# Altium footprint library esd_library.PcbLib: 57 footprints (part 1 of 4)
Each footprint in its own frame and in the unit in brackets; x right, y up, seen from the top. Pads: shape width x height; smd on the part's side, far side on the other; paste and mask are expansions set on the pad; w line width, h text height; cw(c..) or ccw(c..) is an arc to the next point about the centre after c.
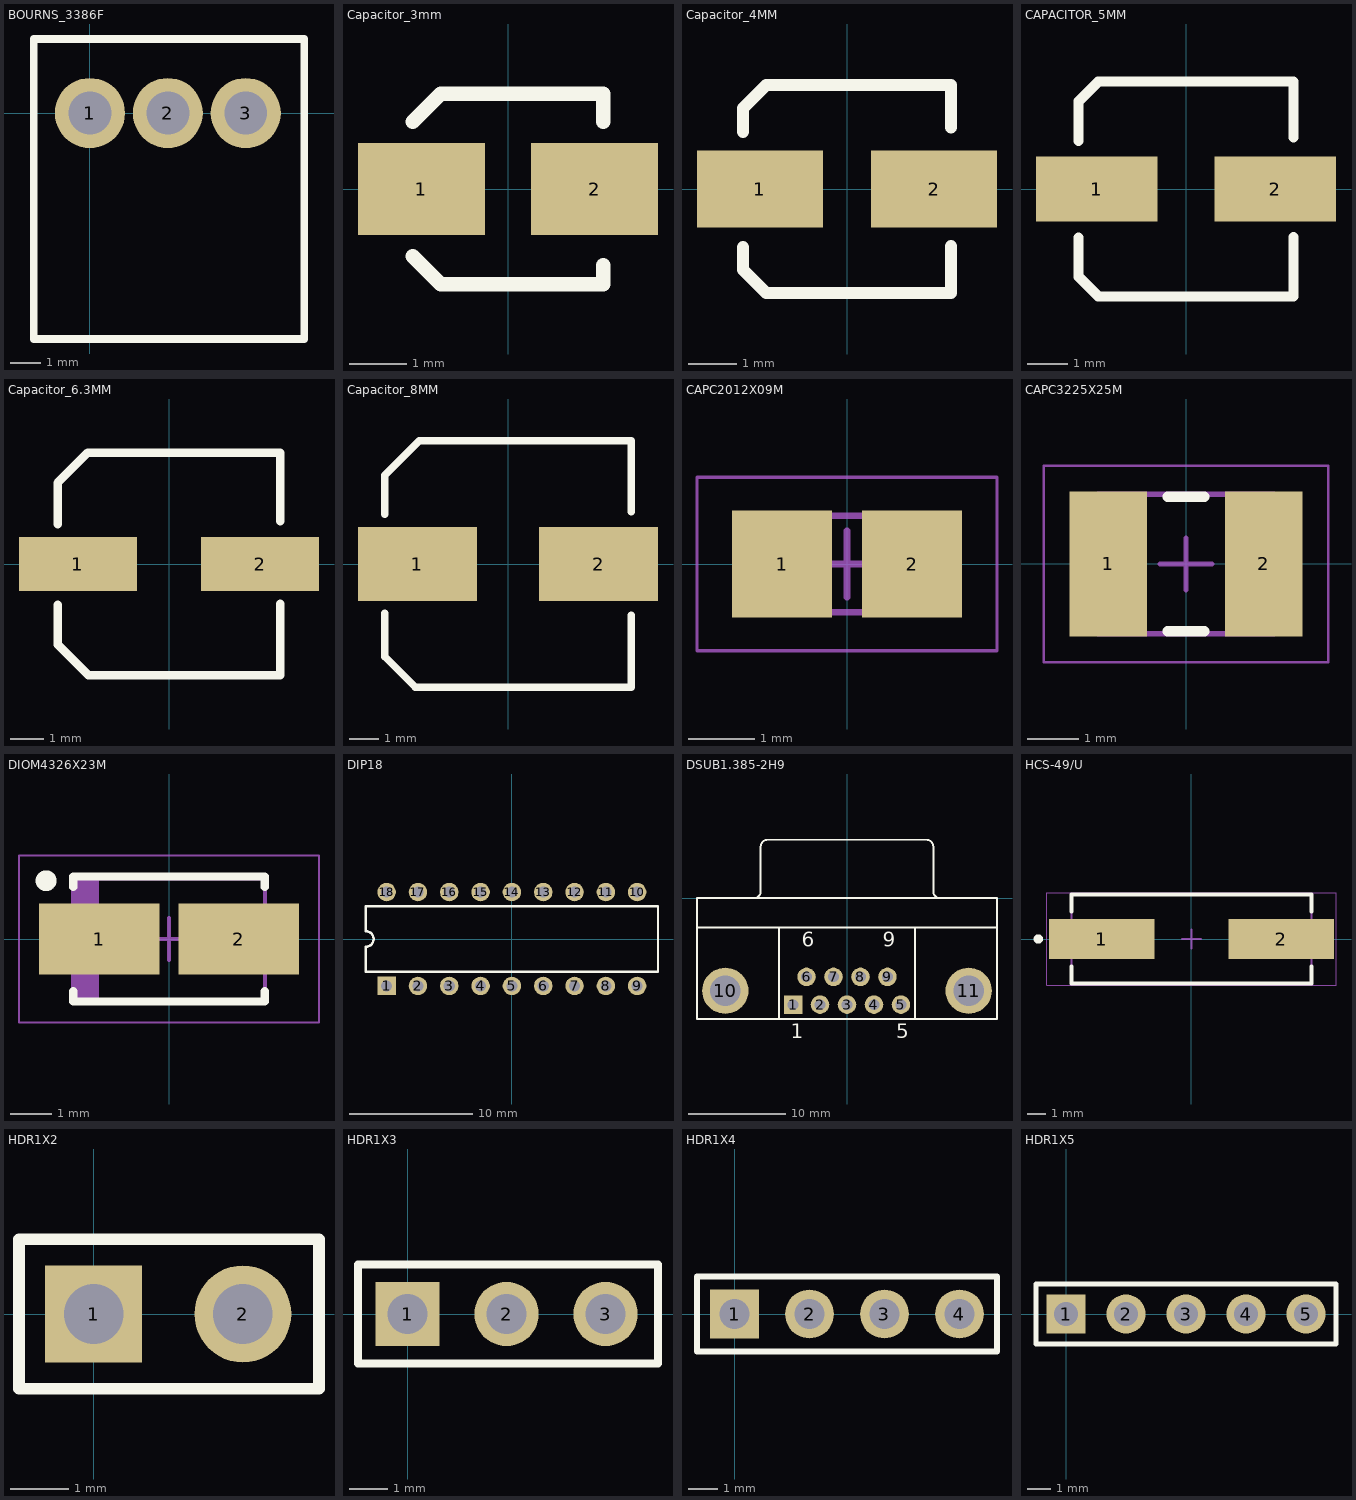
[diagram p0: the footprints below, top view; thin cyan lines are the x and y axes]

## BOURNS_3386F [mil] "Top Adjust Trimpot"
pads (3):
  round 90 hole 55: 1(0,0) 2(100,0) 3(200,0)
Top Overlay:
  lines w10: -72,-290 275,-290 275,95 -72,95 -72,-290
3D body "User Library-3352T.step": height 150, standoff -187.01, extent -73.99,-286 275.99,89

## Capacitor_3mm [mm]
pads (2):
  rect 2.2x1.6 smd: 1(-1.5,0) 2(1.5,0)
Top Overlay:
  lines w0.254: -1.65,-1.168 -1.168,-1.65 1.65,-1.65 1.65,-1.321 ; -1.65,1.168 -1.168,1.65 1.65,1.65 1.65,1.168
3D body "C-4X6_1.stp": height 6.15, standoff 0, extent -2.6,-2.15 2.6,2.15

## Capacitor_4MM [mm]
pads (2):
  rect 2.6x1.6 smd: 1(-1.8,0) 2(1.8,0)
Top Overlay:
  lines w0.254: -2.15,-1.203 -2.15,-1.668 -1.668,-2.15 2.15,-2.15 2.15,-1.185 ; -2.15,1.185 -2.15,1.668 -1.668,2.15 2.15,2.15 2.15,1.27
3D body "C-4X6_1.stp": height 6.15, standoff 0, extent -2.6,-2.15 2.6,2.15

## CAPACITOR_5MM [mm]
pads (2):
  rect 3x1.6 smd: 1(-2.2,0) 2(2.2,0)
Top Overlay:
  lines w0.254: -2.65,-1.203 -2.65,-2.168 -2.168,-2.65 2.65,-2.65 2.65,-1.185 ; -2.65,1.185 -2.65,2.168 -2.168,2.65 2.65,2.65 2.65,1.27
3D body "C-5X6_1.stp": height 6.15, standoff 0, extent -3.1,-2.65 3.1,2.65

## Capacitor_6.3MM [mm]
pads (2):
  rect 3.5x1.6 smd: 1(-2.7,0) 2(2.7,0)
Top Overlay:
  lines w0.254: -3.3,-1.203 -3.3,-2.39 -2.39,-3.3 3.3,-3.3 3.3,-1.185 ; -3.3,1.185 -3.3,2.415 -2.415,3.3 3.3,3.3 3.3,1.27
3D body "C-6_3X8.stp": height 8.1, standoff 0, extent -3.8,-3.3 3.8,3.3

## Capacitor_8MM [mm]
pads (2):
  rect 4x2.5 smd: 1(-3.05,0) 2(3.05,0)
Top Overlay:
  lines w0.254: -4.15,-1.651 -4.15,-3.114 -3.114,-4.15 4.15,-4.15 4.15,-1.727 ; -4.15,1.676 -4.15,2.987 -2.987,4.15 4.15,4.15 4.15,1.753
3D body "C-8X10_5.stp": height 10.45, standoff 0, extent -4.65,-4.15 4.65,4.15

## CAPC2012X09M [mm] "Chip Capacitor, 2-Leads, Body 2.00x1.25mm, IPC Low Density"
height 0.88
pads (2):
  rect 1.5x1.6 smd: 1(-0.975,0) 2(0.975,0)
Mechanical 13:
  lines w0.1: -1.1,-0.725 1.1,-0.725 1.1,0.725 -1.1,0.725 -1.1,-0.725
Mechanical 15:
  lines w0.05: -2.25,-1.3 2.25,-1.3 2.25,1.3 -2.25,1.3 -2.25,-1.3
  lines w0.1: -0.5,0 0.5,0 ; 0,-0.5 0,0.5
3D body: height 0.88, standoff 0, extent 0.6,-0.725 1.1,0.725
3D body: height 0.88, standoff 0, extent -1.1,-0.725 -0.6,0.725
3D body: height 0.88, standoff 0, extent -0.6,-0.725 0.6,0.725

## CAPC3225X25M [mm] "Chip Capacitor, 2-Leads, Body 3.20x2.50mm, IPC Low Density"
height 2.5
pads (2):
  rect 1.5x2.8 smd: 1(-1.5,0) 2(1.5,0)
Top Overlay:
  lines w0.2: -0.35,-1.3 0.35,-1.3 ; -0.35,1.3 0.35,1.3
Mechanical 13:
  lines w0.1: -1.7,-1.35 1.7,-1.35 1.7,1.35 -1.7,1.35 -1.7,-1.35
Mechanical 15:
  lines w0.05: -2.75,-1.9 2.75,-1.9 2.75,1.9 -2.75,1.9 -2.75,-1.9
  lines w0.1: -0.5,0 0.5,0 ; 0,-0.5 0,0.5
3D body: height 2.5, standoff 0, extent 1.2,-1.35 1.7,1.35
3D body: height 2.5, standoff 0, extent -1.7,-1.35 -1.2,1.35
3D body: height 2.5, standoff 0, extent -1.2,-1.35 1.2,1.35

## DIOM4326X23M [mm] "Molded Diode, 2-Leads, Body 4.30x2.60mm, IPC Low Density"
height 2.3
pads (2):
  rect 2.9x1.7 smd: 1(-1.675,0) 2(1.675,0)
Top Overlay:
  circle w0.25: c-2.95,1.4 r0.125
  lines w0.2: -2.3,-1.25 -2.3,-1.5 2.3,-1.5 2.3,-1.25 ; -2.3,1.25 -2.3,1.5 2.3,1.5 2.3,1.25
Mechanical 13:
  rectangle: -2.3,-1.46 -1.681,1.46
  lines w0.1: -2.3,-1.46 -2.3,1.46 2.3,1.46 2.3,-1.46 -2.3,-1.46
Mechanical 15:
  lines w0.05: -3.6,-2 -3.6,2 3.6,2 3.6,-2 -3.6,-2
  lines w0.1: -0.5,0 0.5,0 ; 0,-0.5 0,0.5
3D body "User Library-DO-214AC(SMA).step": height 2.36, standoff 0.08, extent -2.743,-1.397 2.743,1.397

## DIP18 [mm] "DIP; 18 Leads; Row Spacing 7.62 mm; Pitch 2.54 mm"
height 3.93
pads (18):
  rect 1.5x1.5 hole 0.9: 1(-10.16,-3.81)
  round 1.5 hole 0.9: 2(-7.62,-3.81) 3(-5.08,-3.81) 4(-2.54,-3.81) 5(0,-3.81) 6(2.54,-3.81) 7(5.08,-3.81) 8(7.62,-3.81) 9(10.16,-3.81) 10(10.16,3.81) 11(7.62,3.81) 12(5.08,3.81) 13(2.54,3.81) 14(0,3.81) 15(-2.54,3.81) 16(-5.08,3.81) 17(-7.62,3.81) 18(-10.16,3.81)
Top Overlay:
  lines w0.2: -11.85,-2.65 11.85,-2.65 11.85,2.65 -11.85,2.65 -11.85,0.635 cw(c-11.85,0) -11.85,-0.635 -11.85,-2.65
3D body "DIP18.step": height 6.35, standoff -1.65, extent -11.405,-3.873 11.455,3.874

## DSUB1.385-2H9 [mm] "Connector; D Subminiature; 9 Position; Right Angle; Pitch 1.385 mm"
height 12.75
pads (11):
  rect 1.905x1.905 hole 1.09: 1(-5.54,-10.92)
  round 1.905 hole 1.09: 2(-2.77,-10.92) 3(0,-10.92) 4(2.77,-10.92) 5(5.54,-10.92) 6(-4.155,-8.08) 7(-1.385,-8.08) 8(1.385,-8.08) 9(4.155,-8.08)
  round 4.76 hole 3.1: 10(-12.495,-9.5) 11(12.495,-9.5)
Top Overlay:
  lines w0.2: -15.4,-3 15.4,-3 ; -9.56,0.005 ccw(c-9.56,0.7) -8.865,0.7 -8.865,5.3 ; -8.86,5.305 cw(c-8.165,5.305) -8.165,6 8.165,6 cw(c8.165,5.305) 8.86,5.305 ; -7,-12.4 -7,-3 ; 7,-12.4 7,-3 ; 8.865,5.3 8.865,0.7 ccw(c9.56,0.7) 9.56,0.005 ; -15.4,-12.4 15.4,-12.4 15.4,0 -15.4,0 -15.4,-12.4
  text "6" at -4.655,-4.975 h1.5
  text "9" at 3.655,-4.975 h1.5
  text "5" at 5.04,-14.375 h1.5
  text "1" at -5.79,-14.375 h1.5
3D body "connector_a-df_09_a_kg-f.stp": height 12.88, standoff -4, extent -15.494,-12.687 15.316,5.613

## HCS-49/U [mm] "SMD, 2-Leads, Body 11.4x4.7mm"
height 4.2
pads (2):
  rect 5.6x2.1 smd: 1(-4.75,0) 2(4.75,0)
Top Overlay:
  circle w0.25: c-8.1,0 r0.125
  lines w0.2: -6.35,-1.45 -6.35,-2.35 6.35,-2.35 6.35,-1.45 ; -6.35,1.45 -6.35,2.35 6.35,2.35 6.35,1.45
Mechanical 13:
  lines w0.1: -6.35,-2.35 6.35,-2.35 6.35,2.35 -6.35,2.35 -6.35,-2.35
Mechanical 15:
  lines w0.05: -7.65,-2.45 -7.65,2.45 7.65,2.45 7.65,-2.45 -7.65,-2.45
  lines w0.1: -0.5,0 0.5,0 ; 0,-0.5 0,0.5
3D body "ABLS.STEP": height 4.16, standoff 0, extent -6.35,-2.349 6.35,2.35

## HDR1X2 [mil] "Connector; Header; 4 Position"
pads (2):
  rect 65x65 hole 40: 1(0,0)
  round 65 hole 40: 2(100,0)
Top Overlay:
  lines w7.87: -50,-50 151,-50 151,50 -50,50 -50,-50
3D body "pin_header_aw_108_02-t.stp": height 370.08, standoff -118.11, extent -46.06,-50.26 153.94,48.03

## HDR1X3 [mil] "Connector; Header; 3 Position"
pads (3):
  rect 65x65 hole 40: 1(0,0)
  round 65 hole 40: 2(100,0) 3(200,0)
Top Overlay:
  lines w7.87: -50,-50 -50,50 253,50 253,-50 -50,-50
3D body "pin_header_aw_108_03-t.stp": height 370.08, standoff -118.11, extent -46,-49.28 254,49

## HDR1X4 [mil] "Connector; Header; 4 Position"
pads (4):
  rect 65x65 hole 40: 1(0,0)
  round 65 hole 40: 2(100,0) 3(200,0) 4(300,0)
Top Overlay:
  lines w7.87: -50,-50 350,-50 350,50 -50,50 -50,-50
3D body "pin_header_aw_108_04-t.stp": height 370.08, standoff -118.11, extent -47,-48 353,50.28

## HDR1X5 [mil] "Connector; Header; 5 Position"
pads (5):
  rect 65x65 hole 40: 1(0,0)
  round 65 hole 40: 2(100,0) 3(200,0) 4(300,0) 5(400,0)
Top Overlay:
  lines w7.87: -50,-50 450,-50 450,50 -50,50 -50,-50
3D body "pin_header_aw_108_05-t.stp": height 370.08, standoff -118.11, extent -45,-49.14 455,49.14